# Altium footprint library IC.PcbLib: 386 footprints (part 7 of 30)
Each footprint in its own frame and in the unit in brackets; x right, y up, seen from the top. Pads: shape width x height; smd on the part's side, far side on the other; paste and mask are expansions set on the pad; w line width, h text height; cw(c..) or ccw(c..) is an arc to the next point about the centre after c.
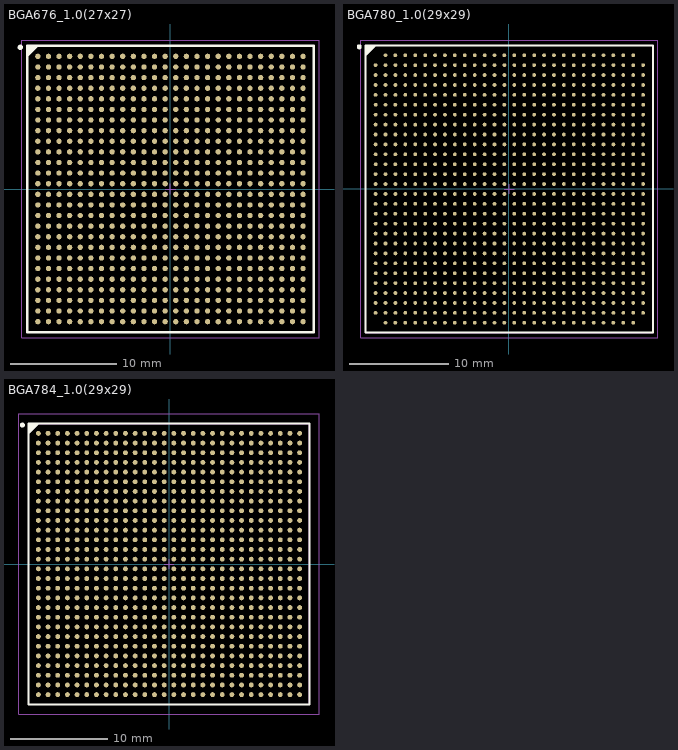
[diagram p6: the footprints below, top view; thin cyan lines are the x and y axes]

## BGA676_1.0(27x27) [mm]
height 0.65
pads (676):
  round 0.5 smd: A1(-12.5,12.525) A2(-11.5,12.525) A3(-10.5,12.525) A4(-9.5,12.525) A5(-8.5,12.525) A6(-7.5,12.525) A7(-6.5,12.525) A8(-5.5,12.525) A9(-4.5,12.525) A10(-3.5,12.525) A11(-2.5,12.525) A12(-1.5,12.525) A13(-0.5,12.525) A14(0.5,12.525) A15(1.5,12.525) A16(2.5,12.525) A17(3.5,12.525) A18(4.5,12.525) A19(5.5,12.525) A20(6.5,12.525) A21(7.5,12.525) A22(8.5,12.525) A23(9.5,12.525) A24(10.5,12.525) A25(11.5,12.525) A26(12.5,12.525) AA1(-12.5,-7.475) AA2(-11.5,-7.475) AA3(-10.5,-7.475) AA4(-9.5,-7.475) AA5(-8.5,-7.475) AA6(-7.5,-7.475) AA7(-6.5,-7.475) AA8(-5.5,-7.475) AA9(-4.5,-7.475) AA10(-3.5,-7.475) AA11(-2.5,-7.475) AA12(-1.5,-7.475) AA13(-0.5,-7.475) AA14(0.5,-7.475) AA15(1.5,-7.475) AA16(2.5,-7.475) AA17(3.5,-7.475) AA18(4.5,-7.475) AA19(5.5,-7.475) AA20(6.5,-7.475) AA21(7.5,-7.475) AA22(8.5,-7.475) AA23(9.5,-7.475) AA24(10.5,-7.475) AA25(11.5,-7.475) AA26(12.5,-7.475) AB1(-12.5,-8.475) AB2(-11.5,-8.475) AB3(-10.5,-8.475) AB4(-9.5,-8.475) AB5(-8.5,-8.475) AB6(-7.5,-8.475) AB7(-6.5,-8.475) AB8(-5.5,-8.475) AB9(-4.5,-8.475) AB10(-3.5,-8.475) AB11(-2.5,-8.475) AB12(-1.5,-8.475) AB13(-0.5,-8.475) AB14(0.5,-8.475) AB15(1.5,-8.475) AB16(2.5,-8.475) AB17(3.5,-8.475) AB18(4.5,-8.475) AB19(5.5,-8.475) AB20(6.5,-8.475) AB21(7.5,-8.475) AB22(8.5,-8.475) AB23(9.5,-8.475) AB24(10.5,-8.475) AB25(11.5,-8.475) AB26(12.5,-8.475) AC1(-12.5,-9.475) AC2(-11.5,-9.475) AC3(-10.5,-9.475) AC4(-9.5,-9.475) AC5(-8.5,-9.475) AC6(-7.5,-9.475) AC7(-6.5,-9.475) AC8(-5.5,-9.475) AC9(-4.5,-9.475) AC10(-3.5,-9.475) AC11(-2.5,-9.475) AC12(-1.5,-9.475) AC13(-0.5,-9.475) AC14(0.5,-9.475) AC15(1.5,-9.475) AC16(2.5,-9.475) AC17(3.5,-9.475) AC18(4.5,-9.475) AC19(5.5,-9.475) AC20(6.5,-9.475) AC21(7.5,-9.475) AC22(8.5,-9.475) AC23(9.5,-9.475) AC24(10.5,-9.475) AC25(11.5,-9.475) AC26(12.5,-9.475) AD1(-12.5,-10.475) AD2(-11.5,-10.475) AD3(-10.5,-10.475) AD4(-9.5,-10.475) AD5(-8.5,-10.475) AD6(-7.5,-10.475) AD7(-6.5,-10.475) AD8(-5.5,-10.475) AD9(-4.5,-10.475) AD10(-3.5,-10.475) AD11(-2.5,-10.475) AD12(-1.5,-10.475) AD13(-0.5,-10.475) AD14(0.5,-10.475) AD15(1.5,-10.475) AD16(2.5,-10.475) AD17(3.5,-10.475) AD18(4.5,-10.475) AD19(5.5,-10.475) AD20(6.5,-10.475) AD21(7.5,-10.475) AD22(8.5,-10.475) AD23(9.5,-10.475) AD24(10.5,-10.475) AD25(11.5,-10.475) AD26(12.5,-10.475) AE1(-12.5,-11.475) AE2(-11.5,-11.475) AE3(-10.5,-11.475) AE4(-9.5,-11.475) AE5(-8.5,-11.475) AE6(-7.5,-11.475) AE7(-6.5,-11.475) AE8(-5.5,-11.475) AE9(-4.5,-11.475) AE10(-3.5,-11.475) AE11(-2.5,-11.475) AE12(-1.5,-11.475) AE13(-0.5,-11.475) AE14(0.5,-11.475) AE15(1.5,-11.475) AE16(2.5,-11.475) AE17(3.5,-11.475) AE18(4.5,-11.475) AE19(5.5,-11.475) AE20(6.5,-11.475) AE21(7.5,-11.475) AE22(8.5,-11.475) AE23(9.5,-11.475) AE24(10.5,-11.475) AE25(11.5,-11.475) AE26(12.5,-11.475) AF1(-12.5,-12.475) AF2(-11.5,-12.475) AF3(-10.5,-12.475) AF4(-9.5,-12.475) AF5(-8.5,-12.475) AF6(-7.5,-12.475) AF7(-6.5,-12.475) AF8(-5.5,-12.475) AF9(-4.5,-12.475) AF10(-3.5,-12.475) AF11(-2.5,-12.475) AF12(-1.5,-12.475) AF13(-0.5,-12.475) AF14(0.5,-12.475) AF15(1.5,-12.475) AF16(2.5,-12.475) AF17(3.5,-12.475) AF18(4.5,-12.475) AF19(5.5,-12.475) AF20(6.5,-12.475) AF21(7.5,-12.475) AF22(8.5,-12.475) AF23(9.5,-12.475) AF24(10.5,-12.475) AF25(11.5,-12.475) AF26(12.5,-12.475) B1(-12.5,11.525) B2(-11.5,11.525) B3(-10.5,11.525) B4(-9.5,11.525) B5(-8.5,11.525) B6(-7.5,11.525) B7(-6.5,11.525) B8(-5.5,11.525) B9(-4.5,11.525) B10(-3.5,11.525) B11(-2.5,11.525) B12(-1.5,11.525) B13(-0.5,11.525) B14(0.5,11.525) B15(1.5,11.525) B16(2.5,11.525) B17(3.5,11.525) B18(4.5,11.525) B19(5.5,11.525) B20(6.5,11.525) B21(7.5,11.525) B22(8.5,11.525) B23(9.5,11.525) B24(10.5,11.525) B25(11.5,11.525) B26(12.5,11.525) C1(-12.5,10.525) C2(-11.5,10.525) C3(-10.5,10.525) C4(-9.5,10.525) C5(-8.5,10.525) C6(-7.5,10.525) C7(-6.5,10.525) C8(-5.5,10.525) C9(-4.5,10.525) C10(-3.5,10.525) C11(-2.5,10.525) C12(-1.5,10.525) C13(-0.5,10.525) C14(0.5,10.525) C15(1.5,10.525) C16(2.5,10.525) C17(3.5,10.525) C18(4.5,10.525) C19(5.5,10.525) C20(6.5,10.525) C21(7.5,10.525) C22(8.5,10.525) C23(9.5,10.525) C24(10.5,10.525) C25(11.5,10.525) C26(12.5,10.525) D1(-12.5,9.525) D2(-11.5,9.525) D3(-10.5,9.525) D4(-9.5,9.525) D5(-8.5,9.525) D6(-7.5,9.525) D7(-6.5,9.525) D8(-5.5,9.525) D9(-4.5,9.525) D10(-3.5,9.525) D11(-2.5,9.525) D12(-1.5,9.525) D13(-0.5,9.525) D14(0.5,9.525) D15(1.5,9.525) D16(2.5,9.525) D17(3.5,9.525) D18(4.5,9.525) D19(5.5,9.525) D20(6.5,9.525) D21(7.5,9.525) D22(8.5,9.525) D23(9.5,9.525) D24(10.5,9.525) D25(11.5,9.525) D26(12.5,9.525) E1(-12.5,8.525) E2(-11.5,8.525) E3(-10.5,8.525) E4(-9.5,8.525) E5(-8.5,8.525) E6(-7.5,8.525) E7(-6.5,8.525) E8(-5.5,8.525) E9(-4.5,8.525) E10(-3.5,8.525) E11(-2.5,8.525) E12(-1.5,8.525) E13(-0.5,8.525) E14(0.5,8.525) E15(1.5,8.525) E16(2.5,8.525) E17(3.5,8.525) E18(4.5,8.525) E19(5.5,8.525) E20(6.5,8.525) E21(7.5,8.525) E22(8.5,8.525) E23(9.5,8.525) E24(10.5,8.525) E25(11.5,8.525) E26(12.5,8.525) F1(-12.5,7.525) F2(-11.5,7.525) F3(-10.5,7.525) F4(-9.5,7.525) F5(-8.5,7.525) F6(-7.5,7.525) F7(-6.5,7.525) F8(-5.5,7.525) F9(-4.5,7.525) F10(-3.5,7.525) F11(-2.5,7.525) F12(-1.5,7.525) F13(-0.5,7.525) F14(0.5,7.525) F15(1.5,7.525) F16(2.5,7.525) F17(3.5,7.525) F18(4.5,7.525) F19(5.5,7.525) F20(6.5,7.525) F21(7.5,7.525) F22(8.5,7.525) F23(9.5,7.525) F24(10.5,7.525) F25(11.5,7.525) F26(12.5,7.525) G1(-12.5,6.525) G2(-11.5,6.525) G3(-10.5,6.525) G4(-9.5,6.525) G5(-8.5,6.525) G6(-7.5,6.525) G7(-6.5,6.525) G8(-5.5,6.525) G9(-4.5,6.525) G10(-3.5,6.525) G11(-2.5,6.525) G12(-1.5,6.525) G13(-0.5,6.525) G14(0.5,6.525) G15(1.5,6.525) G16(2.5,6.525) G17(3.5,6.525) G18(4.5,6.525) G19(5.5,6.525) G20(6.5,6.525) G21(7.5,6.525) G22(8.5,6.525) G23(9.5,6.525) G24(10.5,6.525) G25(11.5,6.525) G26(12.5,6.525) H1(-12.5,5.525) H2(-11.5,5.525) H3(-10.5,5.525) H4(-9.5,5.525) H5(-8.5,5.525) H6(-7.5,5.525) H7(-6.5,5.525) H8(-5.5,5.525) H9(-4.5,5.525) H10(-3.5,5.525) H11(-2.5,5.525) H12(-1.5,5.525) H13(-0.5,5.525) H14(0.5,5.525) H15(1.5,5.525) H16(2.5,5.525) H17(3.5,5.525) H18(4.5,5.525) H19(5.5,5.525) H20(6.5,5.525) H21(7.5,5.525) H22(8.5,5.525) H23(9.5,5.525) H24(10.5,5.525) H25(11.5,5.525) H26(12.5,5.525) J1(-12.5,4.525) J2(-11.5,4.525) J3(-10.5,4.525) J4(-9.5,4.525) J5(-8.5,4.525) J6(-7.5,4.525) J7(-6.5,4.525) J8(-5.5,4.525) J9(-4.5,4.525) J10(-3.5,4.525) J11(-2.5,4.525) J12(-1.5,4.525) J13(-0.5,4.525) J14(0.5,4.525) J15(1.5,4.525) J16(2.5,4.525) J17(3.5,4.525) J18(4.5,4.525) J19(5.5,4.525) J20(6.5,4.525) J21(7.5,4.525) J22(8.5,4.525) J23(9.5,4.525) J24(10.5,4.525) J25(11.5,4.525) J26(12.5,4.525) K1(-12.5,3.525) K2(-11.5,3.525) K3(-10.5,3.525) K4(-9.5,3.525) K5(-8.5,3.525) K6(-7.5,3.525) K7(-6.5,3.525) K8(-5.5,3.525) K9(-4.5,3.525) K10(-3.5,3.525) K11(-2.5,3.525) K12(-1.5,3.525) K13(-0.5,3.525) K14(0.5,3.525) K15(1.5,3.525) K16(2.5,3.525) K17(3.5,3.525) K18(4.5,3.525) K19(5.5,3.525) K20(6.5,3.525) K21(7.5,3.525) K22(8.5,3.525) K23(9.5,3.525) K24(10.5,3.525) K25(11.5,3.525) K26(12.5,3.525) L1(-12.5,2.525) L2(-11.5,2.525) L3(-10.5,2.525) L4(-9.5,2.525) L5(-8.5,2.525) L6(-7.5,2.525) L7(-6.5,2.525) L8(-5.5,2.525) L9(-4.5,2.525) L10(-3.5,2.525) L11(-2.5,2.525) L12(-1.5,2.525) L13(-0.5,2.525) L14(0.5,2.525) L15(1.5,2.525) L16(2.5,2.525) L17(3.5,2.525) L18(4.5,2.525) L19(5.5,2.525) L20(6.5,2.525) L21(7.5,2.525) L22(8.5,2.525) L23(9.5,2.525) L24(10.5,2.525) L25(11.5,2.525) L26(12.5,2.525) M1(-12.5,1.525) M2(-11.5,1.525) M3(-10.5,1.525) M4(-9.5,1.525) M5(-8.5,1.525) M6(-7.5,1.525) M7(-6.5,1.525) M8(-5.5,1.525) M9(-4.5,1.525) M10(-3.5,1.525) M11(-2.5,1.525) M12(-1.5,1.525) M13(-0.5,1.525) M14(0.5,1.525) M15(1.5,1.525) M16(2.5,1.525) M17(3.5,1.525) M18(4.5,1.525) M19(5.5,1.525) M20(6.5,1.525) M21(7.5,1.525) M22(8.5,1.525) M23(9.5,1.525) M24(10.5,1.525) M25(11.5,1.525) M26(12.5,1.525) N1(-12.5,0.525) N2(-11.5,0.525) N3(-10.5,0.525) N4(-9.5,0.525) N5(-8.5,0.525) N6(-7.5,0.525) N7(-6.5,0.525) N8(-5.5,0.525) N9(-4.5,0.525) N10(-3.5,0.525) N11(-2.5,0.525) N12(-1.5,0.525) N13(-0.5,0.525) N14(0.5,0.525) N15(1.5,0.525) N16(2.5,0.525) N17(3.5,0.525) N18(4.5,0.525) N19(5.5,0.525) N20(6.5,0.525) N21(7.5,0.525) N22(8.5,0.525) N23(9.5,0.525) N24(10.5,0.525) N25(11.5,0.525) N26(12.5,0.525) P1(-12.5,-0.475) P2(-11.5,-0.475) P3(-10.5,-0.475) P4(-9.5,-0.475) P5(-8.5,-0.475) P6(-7.5,-0.475) P7(-6.5,-0.475) P8(-5.5,-0.475) P9(-4.5,-0.475) P10(-3.5,-0.475) P11(-2.5,-0.475) P12(-1.5,-0.475) P13(-0.5,-0.475) P14(0.5,-0.475) P15(1.5,-0.475) P16(2.5,-0.475) P17(3.5,-0.475) P18(4.5,-0.475) P19(5.5,-0.475) P20(6.5,-0.475) P21(7.5,-0.475) P22(8.5,-0.475) P23(9.5,-0.475) P24(10.5,-0.475) P25(11.5,-0.475) P26(12.5,-0.475) R1(-12.5,-1.475) R2(-11.5,-1.475) R3(-10.5,-1.475) R4(-9.5,-1.475) R5(-8.5,-1.475) R6(-7.5,-1.475) R7(-6.5,-1.475) R8(-5.5,-1.475) R9(-4.5,-1.475) R10(-3.5,-1.475) R11(-2.5,-1.475) R12(-1.5,-1.475) R13(-0.5,-1.475) R14(0.5,-1.475) R15(1.5,-1.475) R16(2.5,-1.475) R17(3.5,-1.475) R18(4.5,-1.475) R19(5.5,-1.475) R20(6.5,-1.475) R21(7.5,-1.475) R22(8.5,-1.475) R23(9.5,-1.475) R24(10.5,-1.475) R25(11.5,-1.475) R26(12.5,-1.475) T1(-12.5,-2.475) T2(-11.5,-2.475) T3(-10.5,-2.475) T4(-9.5,-2.475) T5(-8.5,-2.475) T6(-7.5,-2.475) T7(-6.5,-2.475) T8(-5.5,-2.475) T9(-4.5,-2.475) T10(-3.5,-2.475) T11(-2.5,-2.475) T12(-1.5,-2.475) T13(-0.5,-2.475) T14(0.5,-2.475) T15(1.5,-2.475) T16(2.5,-2.475) T17(3.5,-2.475) T18(4.5,-2.475) T19(5.5,-2.475) T20(6.5,-2.475) T21(7.5,-2.475) T22(8.5,-2.475) T23(9.5,-2.475) T24(10.5,-2.475) T25(11.5,-2.475) T26(12.5,-2.475) U1(-12.5,-3.475) U2(-11.5,-3.475) U3(-10.5,-3.475) U4(-9.5,-3.475) U5(-8.5,-3.475) U6(-7.5,-3.475) U7(-6.5,-3.475) U8(-5.5,-3.475) U9(-4.5,-3.475) U10(-3.5,-3.475) U11(-2.5,-3.475) U12(-1.5,-3.475) U13(-0.5,-3.475) U14(0.5,-3.475) U15(1.5,-3.475) U16(2.5,-3.475) U17(3.5,-3.475) U18(4.5,-3.475) U19(5.5,-3.475) U20(6.5,-3.475) U21(7.5,-3.475) U22(8.5,-3.475) U23(9.5,-3.475) U24(10.5,-3.475) U25(11.5,-3.475) U26(12.5,-3.475) V1(-12.5,-4.475) V2(-11.5,-4.475) V3(-10.5,-4.475) V4(-9.5,-4.475) V5(-8.5,-4.475) V6(-7.5,-4.475) V7(-6.5,-4.475) V8(-5.5,-4.475) V9(-4.5,-4.475) V10(-3.5,-4.475) V11(-2.5,-4.475) V12(-1.5,-4.475) V13(-0.5,-4.475) V14(0.5,-4.475) V15(1.5,-4.475) V16(2.5,-4.475) V17(3.5,-4.475) V18(4.5,-4.475) V19(5.5,-4.475) V20(6.5,-4.475) V21(7.5,-4.475) V22(8.5,-4.475) V23(9.5,-4.475) V24(10.5,-4.475) V25(11.5,-4.475) V26(12.5,-4.475) W1(-12.5,-5.475) W2(-11.5,-5.475) W3(-10.5,-5.475) W4(-9.5,-5.475) W5(-8.5,-5.475) W6(-7.5,-5.475) W7(-6.5,-5.475) W8(-5.5,-5.475) W9(-4.5,-5.475) W10(-3.5,-5.475) W11(-2.5,-5.475) W12(-1.5,-5.475) W13(-0.5,-5.475) W14(0.5,-5.475) W15(1.5,-5.475) W16(2.5,-5.475) W17(3.5,-5.475) W18(4.5,-5.475) W19(5.5,-5.475) W20(6.5,-5.475) W21(7.5,-5.475) W22(8.5,-5.475) W23(9.5,-5.475) W24(10.5,-5.475) W25(11.5,-5.475) W26(12.5,-5.475) Y1(-12.5,-6.475) Y2(-11.5,-6.475) Y3(-10.5,-6.475) Y4(-9.5,-6.475) Y5(-8.5,-6.475) Y6(-7.5,-6.475) Y7(-6.5,-6.475) Y8(-5.5,-6.475) Y9(-4.5,-6.475) Y10(-3.5,-6.475) Y11(-2.5,-6.475) Y12(-1.5,-6.475) Y13(-0.5,-6.475) Y14(0.5,-6.475) Y15(1.5,-6.475) Y16(2.5,-6.475) Y17(3.5,-6.475) Y18(4.5,-6.475) Y19(5.5,-6.475) Y20(6.5,-6.475) Y21(7.5,-6.475) Y22(8.5,-6.475) Y23(9.5,-6.475) Y24(10.5,-6.475) Y25(11.5,-6.475) Y26(12.5,-6.475)
Top Overlay:
  circle w0.25: c-14.15,13.375 r0.125
  region: -12.5,13.525 -13.5,12.525 -13.5,13.525
  lines w0.2: -13.5,12.525 -12.5,13.525 ; -13.5,-13.475 13.5,-13.475 13.5,13.525 -13.5,13.525 -13.5,-13.475
Mechanical 13:
  lines w0.1: -13.5,-13.475 13.5,-13.475 13.5,13.525 -13.5,13.525 -13.5,-13.475
Mechanical 15:
  lines w0.05: -14,-13.975 14,-13.975 14,14.025 -14,14.025 -14,-13.975
  lines w0.1: -0.5,0.025 0.5,0.025 ; 0,-0.475 0,0.525
3D body "User Library-BGA_676_27x27_P1_00_PLS.step": height 2.95, standoff 0.05, extent -13.825,-13.774 13.775,13.826

## BGA780_1.0(29x29) [mm]
pads (780):
  round 0.38 smd: A2(-12.449,13.475) A3(-11.449,13.475) A4(-10.449,13.475) A5(-9.449,13.475) A6(-8.449,13.475) A7(-7.449,13.475) A8(-6.449,13.475) A9(-5.449,13.475) A10(-4.449,13.475) A11(-3.449,13.475) A12(-2.449,13.475) A13(-1.449,13.475) A14(-0.449,13.475) A15(0.551,13.475) A16(1.551,13.475) A17(2.551,13.475) A18(3.551,13.475) A19(4.551,13.475) A20(5.551,13.475) A21(6.551,13.475) A22(7.551,13.475) A23(8.551,13.475) A24(9.551,13.475) A25(10.551,13.475) A26(11.551,13.475) A27(12.551,13.475) AA1(-13.449,-6.525) AA2(-12.449,-6.525) AA3(-11.449,-6.525) AA4(-10.449,-6.525) AA5(-9.449,-6.525) AA6(-8.449,-6.525) AA7(-7.449,-6.525) AA8(-6.449,-6.525) AA9(-5.449,-6.525) AA10(-4.449,-6.525) AA11(-3.449,-6.525) AA12(-2.449,-6.525) AA13(-1.449,-6.525) AA14(-0.449,-6.525) AA15(0.551,-6.525) AA16(1.551,-6.525) AA17(2.551,-6.525) AA18(3.551,-6.525) AA19(4.551,-6.525) AA20(5.551,-6.525) AA21(6.551,-6.525) AA22(7.551,-6.525) AA23(8.551,-6.525) AA24(9.551,-6.525) AA25(10.551,-6.525) AA26(11.551,-6.525) AA27(12.551,-6.525) AA28(13.551,-6.525) AB1(-13.449,-7.525) AB2(-12.449,-7.525) AB3(-11.449,-7.525) AB4(-10.449,-7.525) AB5(-9.449,-7.525) AB6(-8.449,-7.525) AB7(-7.449,-7.525) AB8(-6.449,-7.525) AB9(-5.449,-7.525) AB10(-4.449,-7.525) AB11(-3.449,-7.525) AB12(-2.449,-7.525) AB13(-1.449,-7.525) AB14(-0.449,-7.525) AB15(0.551,-7.525) AB16(1.551,-7.525) AB17(2.551,-7.525) AB18(3.551,-7.525) AB19(4.551,-7.525) AB20(5.551,-7.525) AB21(6.551,-7.525) AB22(7.551,-7.525) AB23(8.551,-7.525) AB24(9.551,-7.525) AB25(10.551,-7.525) AB26(11.551,-7.525) AB27(12.551,-7.525) AB28(13.551,-7.525) AC1(-13.449,-8.525) AC2(-12.449,-8.525) AC3(-11.449,-8.525) AC4(-10.449,-8.525) AC5(-9.449,-8.525) AC6(-8.449,-8.525) AC7(-7.449,-8.525) AC8(-6.449,-8.525) AC9(-5.449,-8.525) AC10(-4.449,-8.525) AC11(-3.449,-8.525) AC12(-2.449,-8.525) AC13(-1.449,-8.525) AC14(-0.449,-8.525) AC15(0.551,-8.525) AC16(1.551,-8.525) AC17(2.551,-8.525) AC18(3.551,-8.525) AC19(4.551,-8.525) AC20(5.551,-8.525) AC21(6.551,-8.525) AC22(7.551,-8.525) AC23(8.551,-8.525) AC24(9.551,-8.525) AC25(10.551,-8.525) AC26(11.551,-8.525) AC27(12.551,-8.525) AC28(13.551,-8.525) AD1(-13.449,-9.525) AD2(-12.449,-9.525) AD3(-11.449,-9.525) AD4(-10.449,-9.525) AD5(-9.449,-9.525) AD6(-8.449,-9.525) AD7(-7.449,-9.525) AD8(-6.449,-9.525) AD9(-5.449,-9.525) AD10(-4.449,-9.525) AD11(-3.449,-9.525) AD12(-2.449,-9.525) AD13(-1.449,-9.525) AD14(-0.449,-9.525) AD15(0.551,-9.525) AD16(1.551,-9.525) AD17(2.551,-9.525) AD18(3.551,-9.525) AD19(4.551,-9.525) AD20(5.551,-9.525) AD21(6.551,-9.525) AD22(7.551,-9.525) AD23(8.551,-9.525) AD24(9.551,-9.525) AD25(10.551,-9.525) AD26(11.551,-9.525) AD27(12.551,-9.525) AD28(13.551,-9.525) AE1(-13.449,-10.525) AE2(-12.449,-10.525) AE3(-11.449,-10.525) AE4(-10.449,-10.525) AE5(-9.449,-10.525) AE6(-8.449,-10.525) AE7(-7.449,-10.525) AE8(-6.449,-10.525) AE9(-5.449,-10.525) AE10(-4.449,-10.525) AE11(-3.449,-10.525) AE12(-2.449,-10.525) AE13(-1.449,-10.525) AE14(-0.449,-10.525) AE15(0.551,-10.525) AE16(1.551,-10.525) AE17(2.551,-10.525) AE18(3.551,-10.525) AE19(4.551,-10.525) AE20(5.551,-10.525) AE21(6.551,-10.525) AE22(7.551,-10.525) AE23(8.551,-10.525) AE24(9.551,-10.525) AE25(10.551,-10.525) AE26(11.551,-10.525) AE27(12.551,-10.525) AE28(13.551,-10.525) AF1(-13.449,-11.525) AF2(-12.449,-11.525) AF3(-11.449,-11.525) AF4(-10.449,-11.525) AF5(-9.449,-11.525) AF6(-8.449,-11.525) AF7(-7.449,-11.525) AF8(-6.449,-11.525) AF9(-5.449,-11.525) AF10(-4.449,-11.525) AF11(-3.449,-11.525) AF12(-2.449,-11.525) AF13(-1.449,-11.525) AF14(-0.449,-11.525) AF15(0.551,-11.525) AF16(1.551,-11.525) AF17(2.551,-11.525) AF18(3.551,-11.525) AF19(4.551,-11.525) AF20(5.551,-11.525) AF21(6.551,-11.525) AF22(7.551,-11.525) AF23(8.551,-11.525) AF24(9.551,-11.525) AF25(10.551,-11.525) AF26(11.551,-11.525) AF27(12.551,-11.525) AF28(13.551,-11.525) AG1(-13.449,-12.525) AG2(-12.449,-12.525) AG3(-11.449,-12.525) AG4(-10.449,-12.525) AG5(-9.449,-12.525) AG6(-8.449,-12.525) AG7(-7.449,-12.525) AG8(-6.449,-12.525) AG9(-5.449,-12.525) AG10(-4.449,-12.525) AG11(-3.449,-12.525) AG12(-2.449,-12.525) AG13(-1.449,-12.525) AG14(-0.449,-12.525) AG15(0.551,-12.525) AG16(1.551,-12.525) AG17(2.551,-12.525) AG18(3.551,-12.525) AG19(4.551,-12.525) AG20(5.551,-12.525) AG21(6.551,-12.525) AG22(7.551,-12.525) AG23(8.551,-12.525) AG24(9.551,-12.525) AG25(10.551,-12.525) AG26(11.551,-12.525) AG27(12.551,-12.525) AG28(13.551,-12.525) AH2(-12.449,-13.525) AH3(-11.449,-13.525) AH4(-10.449,-13.525) AH5(-9.449,-13.525) AH6(-8.449,-13.525) AH7(-7.449,-13.525) AH8(-6.449,-13.525) AH9(-5.449,-13.525) AH10(-4.449,-13.525) AH11(-3.449,-13.525) AH12(-2.449,-13.525) AH13(-1.449,-13.525) AH14(-0.449,-13.525) AH15(0.551,-13.525) AH16(1.551,-13.525) AH17(2.551,-13.525) AH18(3.551,-13.525) AH19(4.551,-13.525) AH20(5.551,-13.525) AH21(6.551,-13.525) AH22(7.551,-13.525) AH23(8.551,-13.525) AH24(9.551,-13.525) AH25(10.551,-13.525) AH26(11.551,-13.525) AH27(12.551,-13.525) B1(-13.449,12.475) B2(-12.449,12.475) B3(-11.449,12.475) B4(-10.449,12.475) B5(-9.449,12.475) B6(-8.449,12.475) B7(-7.449,12.475) B8(-6.449,12.475) B9(-5.449,12.475) B10(-4.449,12.475) B11(-3.449,12.475) B12(-2.449,12.475) B13(-1.449,12.475) B14(-0.449,12.475) B15(0.551,12.475) B16(1.551,12.475) B17(2.551,12.475) B18(3.551,12.475) B19(4.551,12.475) B20(5.551,12.475) B21(6.551,12.475) B22(7.551,12.475) B23(8.551,12.475) B24(9.551,12.475) B25(10.551,12.475) B26(11.551,12.475) B27(12.551,12.475) B28(13.551,12.475) C1(-13.449,11.475) C2(-12.449,11.475) C3(-11.449,11.475) C4(-10.449,11.475) C5(-9.449,11.475) C6(-8.449,11.475) C7(-7.449,11.475) C8(-6.449,11.475) C9(-5.449,11.475) C10(-4.449,11.475) C11(-3.449,11.475) C12(-2.449,11.475) C13(-1.449,11.475) C14(-0.449,11.475) C15(0.551,11.475) C16(1.551,11.475) C17(2.551,11.475) C18(3.551,11.475) C19(4.551,11.475) C20(5.551,11.475) C21(6.551,11.475) C22(7.551,11.475) C23(8.551,11.475) C24(9.551,11.475) C25(10.551,11.475) C26(11.551,11.475) C27(12.551,11.475) C28(13.551,11.475) D1(-13.449,10.475) D2(-12.449,10.475) D3(-11.449,10.475) D4(-10.449,10.475) D5(-9.449,10.475) D6(-8.449,10.475) D7(-7.449,10.475) D8(-6.449,10.475) D9(-5.449,10.475) D10(-4.449,10.475) D11(-3.449,10.475) D12(-2.449,10.475) D13(-1.449,10.475) D14(-0.449,10.475) D15(0.551,10.475) D16(1.551,10.475) D17(2.551,10.475) D18(3.551,10.475) D19(4.551,10.475) D20(5.551,10.475) D21(6.551,10.475) D22(7.551,10.475) D23(8.551,10.475) D24(9.551,10.475) D25(10.551,10.475) D26(11.551,10.475) D27(12.551,10.475) D28(13.551,10.475) E1(-13.449,9.475) E2(-12.449,9.475) E3(-11.449,9.475) E4(-10.449,9.475) E5(-9.449,9.475) E6(-8.449,9.475) E7(-7.449,9.475) E8(-6.449,9.475) E9(-5.449,9.475) E10(-4.449,9.475) E11(-3.449,9.475) E12(-2.449,9.475) E13(-1.449,9.475) E14(-0.449,9.475) E15(0.551,9.475) E16(1.551,9.475) E17(2.551,9.475) E18(3.551,9.475) E19(4.551,9.475) E20(5.551,9.475) E21(6.551,9.475) E22(7.551,9.475) E23(8.551,9.475) E24(9.551,9.475) E25(10.551,9.475) E26(11.551,9.475) E27(12.551,9.475) E28(13.551,9.475) F1(-13.449,8.475) F2(-12.449,8.475) F3(-11.449,8.475) F4(-10.449,8.475) F5(-9.449,8.475) F6(-8.449,8.475) F7(-7.449,8.475) F8(-6.449,8.475) F9(-5.449,8.475) F10(-4.449,8.475) F11(-3.449,8.475) F12(-2.449,8.475) F13(-1.449,8.475) F14(-0.449,8.475) F15(0.551,8.475) F16(1.551,8.475) F17(2.551,8.475) F18(3.551,8.475) F19(4.551,8.475) F20(5.551,8.475) F21(6.551,8.475) F22(7.551,8.475) F23(8.551,8.475) F24(9.551,8.475) F25(10.551,8.475) F26(11.551,8.475) F27(12.551,8.475) F28(13.551,8.475) G1(-13.449,7.475) G2(-12.449,7.475) G3(-11.449,7.475) G4(-10.449,7.475) G5(-9.449,7.475) G6(-8.449,7.475) G7(-7.449,7.475) G8(-6.449,7.475) G9(-5.449,7.475) G10(-4.449,7.475) G11(-3.449,7.475) G12(-2.449,7.475) G13(-1.449,7.475) G14(-0.449,7.475) G15(0.551,7.475) G16(1.551,7.475) G17(2.551,7.475) G18(3.551,7.475) G19(4.551,7.475) G20(5.551,7.475) G21(6.551,7.475) G22(7.551,7.475) G23(8.551,7.475) G24(9.551,7.475) G25(10.551,7.475) G26(11.551,7.475) G27(12.551,7.475) G28(13.551,7.475) H1(-13.449,6.475) H2(-12.449,6.475) H3(-11.449,6.475) H4(-10.449,6.475) H5(-9.449,6.475) H6(-8.449,6.475) H7(-7.449,6.475) H8(-6.449,6.475) H9(-5.449,6.475) H10(-4.449,6.475) H11(-3.449,6.475) H12(-2.449,6.475) H13(-1.449,6.475) H14(-0.449,6.475) H15(0.551,6.475) H16(1.551,6.475) H17(2.551,6.475) H18(3.551,6.475) H19(4.551,6.475) H20(5.551,6.475) H21(6.551,6.475) H22(7.551,6.475) H23(8.551,6.475) H24(9.551,6.475) H25(10.551,6.475) H26(11.551,6.475) H27(12.551,6.475) H28(13.551,6.475) J1(-13.449,5.475) J2(-12.449,5.475) J3(-11.449,5.475) J4(-10.449,5.475) J5(-9.449,5.475) J6(-8.449,5.475) J7(-7.449,5.475) J8(-6.449,5.475) J9(-5.449,5.475) J10(-4.449,5.475) J11(-3.449,5.475) J12(-2.449,5.475) J13(-1.449,5.475) J14(-0.449,5.475) J15(0.551,5.475) J16(1.551,5.475) J17(2.551,5.475) J18(3.551,5.475) J19(4.551,5.475) J20(5.551,5.475) J21(6.551,5.475) J22(7.551,5.475) J23(8.551,5.475) J24(9.551,5.475) J25(10.551,5.475) J26(11.551,5.475) J27(12.551,5.475) J28(13.551,5.475) K1(-13.449,4.475) K2(-12.449,4.475) K3(-11.449,4.475) K4(-10.449,4.475) K5(-9.449,4.475) K6(-8.449,4.475) K7(-7.449,4.475) K8(-6.449,4.475) K9(-5.449,4.475) K10(-4.449,4.475) K11(-3.449,4.475) K12(-2.449,4.475) K13(-1.449,4.475) K14(-0.449,4.475) K15(0.551,4.475) K16(1.551,4.475) K17(2.551,4.475) K18(3.551,4.475) K19(4.551,4.475) K20(5.551,4.475) K21(6.551,4.475) K22(7.551,4.475) K23(8.551,4.475) K24(9.551,4.475) K25(10.551,4.475) K26(11.551,4.475) K27(12.551,4.475) K28(13.551,4.475) L1(-13.449,3.475) L2(-12.449,3.475) L3(-11.449,3.475) L4(-10.449,3.475) L5(-9.449,3.475) L6(-8.449,3.475) L7(-7.449,3.475) L8(-6.449,3.475) L9(-5.449,3.475) L10(-4.449,3.475) L11(-3.449,3.475) L12(-2.449,3.475) L13(-1.449,3.475) L14(-0.449,3.475) L15(0.551,3.475) L16(1.551,3.475) L17(2.551,3.475) L18(3.551,3.475) L19(4.551,3.475) L20(5.551,3.475) L21(6.551,3.475) L22(7.551,3.475) L23(8.551,3.475) L24(9.551,3.475) L25(10.551,3.475) L26(11.551,3.475) L27(12.551,3.475) L28(13.551,3.475) M1(-13.449,2.475) M2(-12.449,2.475) M3(-11.449,2.475) M4(-10.449,2.475) M5(-9.449,2.475) M6(-8.449,2.475) M7(-7.449,2.475) M8(-6.449,2.475) M9(-5.449,2.475) M10(-4.449,2.475) M11(-3.449,2.475) M12(-2.449,2.475) M13(-1.449,2.475) M14(-0.449,2.475) M15(0.551,2.475) M16(1.551,2.475) M17(2.551,2.475) M18(3.551,2.475) M19(4.551,2.475) M20(5.551,2.475) M21(6.551,2.475) M22(7.551,2.475) M23(8.551,2.475) M24(9.551,2.475) M25(10.551,2.475) M26(11.551,2.475) M27(12.551,2.475) M28(13.551,2.475) N1(-13.449,1.475) N2(-12.449,1.475) N3(-11.449,1.475) N4(-10.449,1.475) N5(-9.449,1.475) N6(-8.449,1.475) N7(-7.449,1.475) N8(-6.449,1.475) N9(-5.449,1.475) N10(-4.449,1.475) N11(-3.449,1.475) N12(-2.449,1.475) N13(-1.449,1.475) N14(-0.449,1.475) N15(0.551,1.475) N16(1.551,1.475) N17(2.551,1.475) N18(3.551,1.475) N19(4.551,1.475) N20(5.551,1.475) N21(6.551,1.475) N22(7.551,1.475) N23(8.551,1.475) N24(9.551,1.475) N25(10.551,1.475) N26(11.551,1.475) N27(12.551,1.475) N28(13.551,1.475) P1(-13.449,0.475) P2(-12.449,0.475) P3(-11.449,0.475) P4(-10.449,0.475) P5(-9.449,0.475) P6(-8.449,0.475) P7(-7.449,0.475) P8(-6.449,0.475) P9(-5.449,0.475) P10(-4.449,0.475) P11(-3.449,0.475) P12(-2.449,0.475) P13(-1.449,0.475) P14(-0.449,0.475) P15(0.551,0.475) P16(1.551,0.475) P17(2.551,0.475) P18(3.551,0.475) P19(4.551,0.475) P20(5.551,0.475) P21(6.551,0.475) P22(7.551,0.475) P23(8.551,0.475) P24(9.551,0.475) P25(10.551,0.475) P26(11.551,0.475) P27(12.551,0.475) P28(13.551,0.475) R1(-13.449,-0.525) R2(-12.449,-0.525) R3(-11.449,-0.525) R4(-10.449,-0.525) R5(-9.449,-0.525) R6(-8.449,-0.525) R7(-7.449,-0.525) R8(-6.449,-0.525) R9(-5.449,-0.525) R10(-4.449,-0.525) R11(-3.449,-0.525) R12(-2.449,-0.525) R13(-1.449,-0.525) R14(-0.449,-0.525) R15(0.551,-0.525) R16(1.551,-0.525) R17(2.551,-0.525) R18(3.551,-0.525) R19(4.551,-0.525) R20(5.551,-0.525) R21(6.551,-0.525) R22(7.551,-0.525) R23(8.551,-0.525) R24(9.551,-0.525) R25(10.551,-0.525) R26(11.551,-0.525) R27(12.551,-0.525) R28(13.551,-0.525) T1(-13.449,-1.525) T2(-12.449,-1.525) T3(-11.449,-1.525) T4(-10.449,-1.525) T5(-9.449,-1.525) T6(-8.449,-1.525) T7(-7.449,-1.525) T8(-6.449,-1.525) T9(-5.449,-1.525) T10(-4.449,-1.525) T11(-3.449,-1.525) T12(-2.449,-1.525) T13(-1.449,-1.525) T14(-0.449,-1.525) T15(0.551,-1.525) T16(1.551,-1.525) T17(2.551,-1.525) T18(3.551,-1.525) T19(4.551,-1.525) T20(5.551,-1.525) T21(6.551,-1.525) T22(7.551,-1.525) T23(8.551,-1.525) T24(9.551,-1.525) T25(10.551,-1.525) T26(11.551,-1.525) T27(12.551,-1.525) T28(13.551,-1.525) U1(-13.449,-2.525) U2(-12.449,-2.525) U3(-11.449,-2.525) U4(-10.449,-2.525) U5(-9.449,-2.525) U6(-8.449,-2.525) U7(-7.449,-2.525) U8(-6.449,-2.525) U9(-5.449,-2.525) U10(-4.449,-2.525) U11(-3.449,-2.525) U12(-2.449,-2.525) U13(-1.449,-2.525) U14(-0.449,-2.525) U15(0.551,-2.525) U16(1.551,-2.525) U17(2.551,-2.525) U18(3.551,-2.525) U19(4.551,-2.525) U20(5.551,-2.525) U21(6.551,-2.525) U22(7.551,-2.525) U23(8.551,-2.525) U24(9.551,-2.525) U25(10.551,-2.525) U26(11.551,-2.525) U27(12.551,-2.525) U28(13.551,-2.525) V1(-13.449,-3.525) V2(-12.449,-3.525) V3(-11.449,-3.525) V4(-10.449,-3.525) V5(-9.449,-3.525) V6(-8.449,-3.525) V7(-7.449,-3.525) V8(-6.449,-3.525) V9(-5.449,-3.525) V10(-4.449,-3.525) V11(-3.449,-3.525) V12(-2.449,-3.525) V13(-1.449,-3.525) V14(-0.449,-3.525) V15(0.551,-3.525) V16(1.551,-3.525) V17(2.551,-3.525) V18(3.551,-3.525) V19(4.551,-3.525) V20(5.551,-3.525) V21(6.551,-3.525) V22(7.551,-3.525) V23(8.551,-3.525) V24(9.551,-3.525) V25(10.551,-3.525) V26(11.551,-3.525) V27(12.551,-3.525) V28(13.551,-3.525) W1(-13.449,-4.525) W2(-12.449,-4.525) W3(-11.449,-4.525) W4(-10.449,-4.525) W5(-9.449,-4.525) W6(-8.449,-4.525) W7(-7.449,-4.525) W8(-6.449,-4.525) W9(-5.449,-4.525) W10(-4.449,-4.525) W11(-3.449,-4.525) W12(-2.449,-4.525) W13(-1.449,-4.525) W14(-0.449,-4.525) W15(0.551,-4.525) W16(1.551,-4.525) W17(2.551,-4.525) W18(3.551,-4.525) W19(4.551,-4.525) W20(5.551,-4.525) W21(6.551,-4.525) W22(7.551,-4.525) W23(8.551,-4.525) W24(9.551,-4.525) W25(10.551,-4.525) W26(11.551,-4.525) W27(12.551,-4.525) W28(13.551,-4.525) Y1(-13.449,-5.525) Y2(-12.449,-5.525) Y3(-11.449,-5.525) Y4(-10.449,-5.525) Y5(-9.449,-5.525) Y6(-8.449,-5.525) Y7(-7.449,-5.525) Y8(-6.449,-5.525) Y9(-5.449,-5.525) Y10(-4.449,-5.525) Y11(-3.449,-5.525) Y12(-2.449,-5.525) Y13(-1.449,-5.525) Y14(-0.449,-5.525) Y15(0.551,-5.525) Y16(1.551,-5.525) Y17(2.551,-5.525) Y18(3.551,-5.525) Y19(4.551,-5.525) Y20(5.551,-5.525) Y21(6.551,-5.525) Y22(7.551,-5.525) Y23(8.551,-5.525) Y24(9.551,-5.525) Y25(10.551,-5.525) Y26(11.551,-5.525) Y27(12.551,-5.525) Y28(13.551,-5.525)
Top Overlay:
  circle w0.25: c-15.099,14.325 r0.125
  region: -13.449,14.475 -14.449,13.475 -14.449,14.475
  lines w0.2: -14.449,13.475 -13.449,14.475 ; -14.449,-14.525 -14.449,14.475 14.551,14.475 14.551,-14.525 -14.449,-14.525
Mechanical 13:
  lines w0.1: -14.449,-14.525 -14.449,14.475 14.551,14.475 14.551,-14.525 -14.449,-14.525
Mechanical 15:
  lines w0.05: -14.949,-15.025 -14.949,14.975 15.051,14.975 15.051,-15.025 -14.949,-15.025
  lines w0.1: -0.449,-0.025 0.551,-0.025 ; 0.051,-0.525 0.051,0.475
3D body "BGA784C100P28X28_2900X2900X240.step": height 2.4, standoff 0, extent -14.449,-14.475 14.551,14.525

## BGA784_1.0(29x29) [mm]
pads (784):
  round 0.5 smd: A1(-13.515,13.508) A2(-12.515,13.508) A3(-11.515,13.508) A4(-10.515,13.508) A5(-9.515,13.508) A6(-8.515,13.508) A7(-7.515,13.508) A8(-6.515,13.508) A9(-5.515,13.508) A10(-4.515,13.508) A11(-3.515,13.508) A12(-2.515,13.508) A13(-1.515,13.508) A14(-0.515,13.508) A15(0.485,13.508) A16(1.485,13.508) A17(2.485,13.508) A18(3.485,13.508) A19(4.485,13.508) A20(5.485,13.508) A21(6.485,13.508) A22(7.485,13.508) A23(8.485,13.508) A24(9.485,13.508) A25(10.485,13.508) A26(11.485,13.508) A27(12.485,13.508) A28(13.485,13.508) AA1(-13.515,-6.492) AA2(-12.515,-6.492) AA3(-11.515,-6.492) AA4(-10.515,-6.492) AA5(-9.515,-6.492) AA6(-8.515,-6.492) AA7(-7.515,-6.492) AA8(-6.515,-6.492) AA9(-5.515,-6.492) AA10(-4.515,-6.492) AA11(-3.515,-6.492) AA12(-2.515,-6.492) AA13(-1.515,-6.492) AA14(-0.515,-6.492) AA15(0.485,-6.492) AA16(1.485,-6.492) AA17(2.485,-6.492) AA18(3.485,-6.492) AA19(4.485,-6.492) AA20(5.485,-6.492) AA21(6.485,-6.492) AA22(7.485,-6.492) AA23(8.485,-6.492) AA24(9.485,-6.492) AA25(10.485,-6.492) AA26(11.485,-6.492) AA27(12.485,-6.492) AA28(13.485,-6.492) AB1(-13.515,-7.492) AB2(-12.515,-7.492) AB3(-11.515,-7.492) AB4(-10.515,-7.492) AB5(-9.515,-7.492) AB6(-8.515,-7.492) AB7(-7.515,-7.492) AB8(-6.515,-7.492) AB9(-5.515,-7.492) AB10(-4.515,-7.492) AB11(-3.515,-7.492) AB12(-2.515,-7.492) AB13(-1.515,-7.492) AB14(-0.515,-7.492) AB15(0.485,-7.492) AB16(1.485,-7.492) AB17(2.485,-7.492) AB18(3.485,-7.492) AB19(4.485,-7.492) AB20(5.485,-7.492) AB21(6.485,-7.492) AB22(7.485,-7.492) AB23(8.485,-7.492) AB24(9.485,-7.492) AB25(10.485,-7.492) AB26(11.485,-7.492) AB27(12.485,-7.492) AB28(13.485,-7.492) AC1(-13.515,-8.492) AC2(-12.515,-8.492) AC3(-11.515,-8.492) AC4(-10.515,-8.492) AC5(-9.515,-8.492) AC6(-8.515,-8.492) AC7(-7.515,-8.492) AC8(-6.515,-8.492) AC9(-5.515,-8.492) AC10(-4.515,-8.492) AC11(-3.515,-8.492) AC12(-2.515,-8.492) AC13(-1.515,-8.492) AC14(-0.515,-8.492) AC15(0.485,-8.492) AC16(1.485,-8.492) AC17(2.485,-8.492) AC18(3.485,-8.492) AC19(4.485,-8.492) AC20(5.485,-8.492) AC21(6.485,-8.492) AC22(7.485,-8.492) AC23(8.485,-8.492) AC24(9.485,-8.492) AC25(10.485,-8.492) AC26(11.485,-8.492) AC27(12.485,-8.492) AC28(13.485,-8.492) AD1(-13.515,-9.492) AD2(-12.515,-9.492) AD3(-11.515,-9.492) AD4(-10.515,-9.492) AD5(-9.515,-9.492) AD6(-8.515,-9.492) AD7(-7.515,-9.492) AD8(-6.515,-9.492) AD9(-5.515,-9.492) AD10(-4.515,-9.492) AD11(-3.515,-9.492) AD12(-2.515,-9.492) AD13(-1.515,-9.492) AD14(-0.515,-9.492) AD15(0.485,-9.492) AD16(1.485,-9.492) AD17(2.485,-9.492) AD18(3.485,-9.492) AD19(4.485,-9.492) AD20(5.485,-9.492) AD21(6.485,-9.492) AD22(7.485,-9.492) AD23(8.485,-9.492) AD24(9.485,-9.492) AD25(10.485,-9.492) AD26(11.485,-9.492) AD27(12.485,-9.492) AD28(13.485,-9.492) AE1(-13.515,-10.492) AE2(-12.515,-10.492) AE3(-11.515,-10.492) AE4(-10.515,-10.492) AE5(-9.515,-10.492) AE6(-8.515,-10.492) AE7(-7.515,-10.492) AE8(-6.515,-10.492) AE9(-5.515,-10.492) AE10(-4.515,-10.492) AE11(-3.515,-10.492) AE12(-2.515,-10.492) AE13(-1.515,-10.492) AE14(-0.515,-10.492) AE15(0.485,-10.492) AE16(1.485,-10.492) AE17(2.485,-10.492) AE18(3.485,-10.492) AE19(4.485,-10.492) AE20(5.485,-10.492) AE21(6.485,-10.492) AE22(7.485,-10.492) AE23(8.485,-10.492) AE24(9.485,-10.492) AE25(10.485,-10.492) AE26(11.485,-10.492) AE27(12.485,-10.492) AE28(13.485,-10.492) AF1(-13.515,-11.492) AF2(-12.515,-11.492) AF3(-11.515,-11.492) AF4(-10.515,-11.492) AF5(-9.515,-11.492) AF6(-8.515,-11.492) AF7(-7.515,-11.492) AF8(-6.515,-11.492) AF9(-5.515,-11.492) AF10(-4.515,-11.492) AF11(-3.515,-11.492) AF12(-2.515,-11.492) AF13(-1.515,-11.492) AF14(-0.515,-11.492) AF15(0.485,-11.492) AF16(1.485,-11.492) AF17(2.485,-11.492) AF18(3.485,-11.492) AF19(4.485,-11.492) AF20(5.485,-11.492) AF21(6.485,-11.492) AF22(7.485,-11.492) AF23(8.485,-11.492) AF24(9.485,-11.492) AF25(10.485,-11.492) AF26(11.485,-11.492) AF27(12.485,-11.492) AF28(13.485,-11.492) AG1(-13.515,-12.492) AG2(-12.515,-12.492) AG3(-11.515,-12.492) AG4(-10.515,-12.492) AG5(-9.515,-12.492) AG6(-8.515,-12.492) AG7(-7.515,-12.492) AG8(-6.515,-12.492) AG9(-5.515,-12.492) AG10(-4.515,-12.492) AG11(-3.515,-12.492) AG12(-2.515,-12.492) AG13(-1.515,-12.492) AG14(-0.515,-12.492) AG15(0.485,-12.492) AG16(1.485,-12.492) AG17(2.485,-12.492) AG18(3.485,-12.492) AG19(4.485,-12.492) AG20(5.485,-12.492) AG21(6.485,-12.492) AG22(7.485,-12.492) AG23(8.485,-12.492) AG24(9.485,-12.492) AG25(10.485,-12.492) AG26(11.485,-12.492) AG27(12.485,-12.492) AG28(13.485,-12.492) AH1(-13.515,-13.492) AH2(-12.515,-13.492) AH3(-11.515,-13.492) AH4(-10.515,-13.492) AH5(-9.515,-13.492) AH6(-8.515,-13.492) AH7(-7.515,-13.492) AH8(-6.515,-13.492) AH9(-5.515,-13.492) AH10(-4.515,-13.492) AH11(-3.515,-13.492) AH12(-2.515,-13.492) AH13(-1.515,-13.492) AH14(-0.515,-13.492) AH15(0.485,-13.492) AH16(1.485,-13.492) AH17(2.485,-13.492) AH18(3.485,-13.492) AH19(4.485,-13.492) AH20(5.485,-13.492) AH21(6.485,-13.492) AH22(7.485,-13.492) AH23(8.485,-13.492) AH24(9.485,-13.492) AH25(10.485,-13.492) AH26(11.485,-13.492) AH27(12.485,-13.492) AH28(13.485,-13.492) B1(-13.515,12.508) B2(-12.515,12.508) B3(-11.515,12.508) B4(-10.515,12.508) B5(-9.515,12.508) B6(-8.515,12.508) B7(-7.515,12.508) B8(-6.515,12.508) B9(-5.515,12.508) B10(-4.515,12.508) B11(-3.515,12.508) B12(-2.515,12.508) B13(-1.515,12.508) B14(-0.515,12.508) B15(0.485,12.508) B16(1.485,12.508) B17(2.485,12.508) B18(3.485,12.508) B19(4.485,12.508) B20(5.485,12.508) B21(6.485,12.508) B22(7.485,12.508) B23(8.485,12.508) B24(9.485,12.508) B25(10.485,12.508) B26(11.485,12.508) B27(12.485,12.508) B28(13.485,12.508) C1(-13.515,11.508) C2(-12.515,11.508) C3(-11.515,11.508) C4(-10.515,11.508) C5(-9.515,11.508) C6(-8.515,11.508) C7(-7.515,11.508) C8(-6.515,11.508) C9(-5.515,11.508) C10(-4.515,11.508) C11(-3.515,11.508) C12(-2.515,11.508) C13(-1.515,11.508) C14(-0.515,11.508) C15(0.485,11.508) C16(1.485,11.508) C17(2.485,11.508) C18(3.485,11.508) C19(4.485,11.508) C20(5.485,11.508) C21(6.485,11.508) C22(7.485,11.508) C23(8.485,11.508) C24(9.485,11.508) C25(10.485,11.508) C26(11.485,11.508) C27(12.485,11.508) C28(13.485,11.508) D1(-13.515,10.508) D2(-12.515,10.508) D3(-11.515,10.508) D4(-10.515,10.508) D5(-9.515,10.508) D6(-8.515,10.508) D7(-7.515,10.508) D8(-6.515,10.508) D9(-5.515,10.508) D10(-4.515,10.508) D11(-3.515,10.508) D12(-2.515,10.508) D13(-1.515,10.508) D14(-0.515,10.508) D15(0.485,10.508) D16(1.485,10.508) D17(2.485,10.508) D18(3.485,10.508) D19(4.485,10.508) D20(5.485,10.508) D21(6.485,10.508) D22(7.485,10.508) D23(8.485,10.508) D24(9.485,10.508) D25(10.485,10.508) D26(11.485,10.508) D27(12.485,10.508) D28(13.485,10.508) E1(-13.515,9.508) E2(-12.515,9.508) E3(-11.515,9.508) E4(-10.515,9.508) E5(-9.515,9.508) E6(-8.515,9.508) E7(-7.515,9.508) E8(-6.515,9.508) E9(-5.515,9.508) E10(-4.515,9.508) E11(-3.515,9.508) E12(-2.515,9.508) E13(-1.515,9.508) E14(-0.515,9.508) E15(0.485,9.508) E16(1.485,9.508) E17(2.485,9.508) E18(3.485,9.508) E19(4.485,9.508) E20(5.485,9.508) E21(6.485,9.508) E22(7.485,9.508) E23(8.485,9.508) E24(9.485,9.508) E25(10.485,9.508) E26(11.485,9.508) E27(12.485,9.508) E28(13.485,9.508) F1(-13.515,8.508) F2(-12.515,8.508) F3(-11.515,8.508) F4(-10.515,8.508) F5(-9.515,8.508) F6(-8.515,8.508) F7(-7.515,8.508) F8(-6.515,8.508) F9(-5.515,8.508) F10(-4.515,8.508) F11(-3.515,8.508) F12(-2.515,8.508) F13(-1.515,8.508) F14(-0.515,8.508) F15(0.485,8.508) F16(1.485,8.508) F17(2.485,8.508) F18(3.485,8.508) F19(4.485,8.508) F20(5.485,8.508) F21(6.485,8.508) F22(7.485,8.508) F23(8.485,8.508) F24(9.485,8.508) F25(10.485,8.508) F26(11.485,8.508) F27(12.485,8.508) F28(13.485,8.508) G1(-13.515,7.508) G2(-12.515,7.508) G3(-11.515,7.508) G4(-10.515,7.508) G5(-9.515,7.508) G6(-8.515,7.508) G7(-7.515,7.508) G8(-6.515,7.508) G9(-5.515,7.508) G10(-4.515,7.508) G11(-3.515,7.508) G12(-2.515,7.508) G13(-1.515,7.508) G14(-0.515,7.508) G15(0.485,7.508) G16(1.485,7.508) G17(2.485,7.508) G18(3.485,7.508) G19(4.485,7.508) G20(5.485,7.508) G21(6.485,7.508) G22(7.485,7.508) G23(8.485,7.508) G24(9.485,7.508) G25(10.485,7.508) G26(11.485,7.508) G27(12.485,7.508) G28(13.485,7.508) H1(-13.515,6.508) H2(-12.515,6.508) H3(-11.515,6.508) H4(-10.515,6.508) H5(-9.515,6.508) H6(-8.515,6.508) H7(-7.515,6.508) H8(-6.515,6.508) H9(-5.515,6.508) H10(-4.515,6.508) H11(-3.515,6.508) H12(-2.515,6.508) H13(-1.515,6.508) H14(-0.515,6.508) H15(0.485,6.508) H16(1.485,6.508) H17(2.485,6.508) H18(3.485,6.508) H19(4.485,6.508) H20(5.485,6.508) H21(6.485,6.508) H22(7.485,6.508) H23(8.485,6.508) H24(9.485,6.508) H25(10.485,6.508) H26(11.485,6.508) H27(12.485,6.508) H28(13.485,6.508) J1(-13.515,5.508) J2(-12.515,5.508) J3(-11.515,5.508) J4(-10.515,5.508) J5(-9.515,5.508) J6(-8.515,5.508) J7(-7.515,5.508) J8(-6.515,5.508) J9(-5.515,5.508) J10(-4.515,5.508) J11(-3.515,5.508) J12(-2.515,5.508) J13(-1.515,5.508) J14(-0.515,5.508) J15(0.485,5.508) J16(1.485,5.508) J17(2.485,5.508) J18(3.485,5.508) J19(4.485,5.508) J20(5.485,5.508) J21(6.485,5.508) J22(7.485,5.508) J23(8.485,5.508) J24(9.485,5.508) J25(10.485,5.508) J26(11.485,5.508) J27(12.485,5.508) J28(13.485,5.508) K1(-13.515,4.508) K2(-12.515,4.508) K3(-11.515,4.508) K4(-10.515,4.508) K5(-9.515,4.508) K6(-8.515,4.508) K7(-7.515,4.508) K8(-6.515,4.508) K9(-5.515,4.508) K10(-4.515,4.508) K11(-3.515,4.508) K12(-2.515,4.508) K13(-1.515,4.508) K14(-0.515,4.508) K15(0.485,4.508) K16(1.485,4.508) K17(2.485,4.508) K18(3.485,4.508) K19(4.485,4.508) K20(5.485,4.508) K21(6.485,4.508) K22(7.485,4.508) K23(8.485,4.508) K24(9.485,4.508) K25(10.485,4.508) K26(11.485,4.508) K27(12.485,4.508) K28(13.485,4.508) L1(-13.515,3.508) L2(-12.515,3.508) L3(-11.515,3.508) L4(-10.515,3.508) L5(-9.515,3.508) L6(-8.515,3.508) L7(-7.515,3.508) L8(-6.515,3.508) L9(-5.515,3.508) L10(-4.515,3.508) L11(-3.515,3.508) L12(-2.515,3.508) L13(-1.515,3.508) L14(-0.515,3.508) L15(0.485,3.508) L16(1.485,3.508) L17(2.485,3.508) L18(3.485,3.508) L19(4.485,3.508) L20(5.485,3.508) L21(6.485,3.508) L22(7.485,3.508) L23(8.485,3.508) L24(9.485,3.508) L25(10.485,3.508) L26(11.485,3.508) L27(12.485,3.508) L28(13.485,3.508) M1(-13.515,2.508) M2(-12.515,2.508) M3(-11.515,2.508) M4(-10.515,2.508) M5(-9.515,2.508) M6(-8.515,2.508) M7(-7.515,2.508) M8(-6.515,2.508) M9(-5.515,2.508) M10(-4.515,2.508) M11(-3.515,2.508) M12(-2.515,2.508) M13(-1.515,2.508) M14(-0.515,2.508) M15(0.485,2.508) M16(1.485,2.508) M17(2.485,2.508) M18(3.485,2.508) M19(4.485,2.508) M20(5.485,2.508) M21(6.485,2.508) M22(7.485,2.508) M23(8.485,2.508) M24(9.485,2.508) M25(10.485,2.508) M26(11.485,2.508) M27(12.485,2.508) M28(13.485,2.508) N1(-13.515,1.508) N2(-12.515,1.508) N3(-11.515,1.508) N4(-10.515,1.508) N5(-9.515,1.508) N6(-8.515,1.508) N7(-7.515,1.508) N8(-6.515,1.508) N9(-5.515,1.508) N10(-4.515,1.508) N11(-3.515,1.508) N12(-2.515,1.508) N13(-1.515,1.508) N14(-0.515,1.508) N15(0.485,1.508) N16(1.485,1.508) N17(2.485,1.508) N18(3.485,1.508) N19(4.485,1.508) N20(5.485,1.508) N21(6.485,1.508) N22(7.485,1.508) N23(8.485,1.508) N24(9.485,1.508) N25(10.485,1.508) N26(11.485,1.508) N27(12.485,1.508) N28(13.485,1.508) P1(-13.515,0.508) P2(-12.515,0.508) P3(-11.515,0.508) P4(-10.515,0.508) P5(-9.515,0.508) P6(-8.515,0.508) P7(-7.515,0.508) P8(-6.515,0.508) P9(-5.515,0.508) P10(-4.515,0.508) P11(-3.515,0.508) P12(-2.515,0.508) P13(-1.515,0.508) P14(-0.515,0.508) P15(0.485,0.508) P16(1.485,0.508) P17(2.485,0.508) P18(3.485,0.508) P19(4.485,0.508) P20(5.485,0.508) P21(6.485,0.508) P22(7.485,0.508) P23(8.485,0.508) P24(9.485,0.508) P25(10.485,0.508) P26(11.485,0.508) P27(12.485,0.508) P28(13.485,0.508) R1(-13.515,-0.492) R2(-12.515,-0.492) R3(-11.515,-0.492) R4(-10.515,-0.492) R5(-9.515,-0.492) R6(-8.515,-0.492) R7(-7.515,-0.492) R8(-6.515,-0.492) R9(-5.515,-0.492) R10(-4.515,-0.492) R11(-3.515,-0.492) R12(-2.515,-0.492) R13(-1.515,-0.492) R14(-0.515,-0.492) R15(0.485,-0.492) R16(1.485,-0.492) R17(2.485,-0.492) R18(3.485,-0.492) R19(4.485,-0.492) R20(5.485,-0.492) R21(6.485,-0.492) R22(7.485,-0.492) R23(8.485,-0.492) R24(9.485,-0.492) R25(10.485,-0.492) R26(11.485,-0.492) R27(12.485,-0.492) R28(13.485,-0.492) T1(-13.515,-1.492) T2(-12.515,-1.492) T3(-11.515,-1.492) T4(-10.515,-1.492) T5(-9.515,-1.492) T6(-8.515,-1.492) T7(-7.515,-1.492) T8(-6.515,-1.492) T9(-5.515,-1.492) T10(-4.515,-1.492) T11(-3.515,-1.492) T12(-2.515,-1.492) T13(-1.515,-1.492) T14(-0.515,-1.492) T15(0.485,-1.492) T16(1.485,-1.492) T17(2.485,-1.492) T18(3.485,-1.492) T19(4.485,-1.492) T20(5.485,-1.492) T21(6.485,-1.492) T22(7.485,-1.492) T23(8.485,-1.492) T24(9.485,-1.492) T25(10.485,-1.492) T26(11.485,-1.492) T27(12.485,-1.492) T28(13.485,-1.492) U1(-13.515,-2.492) U2(-12.515,-2.492) U3(-11.515,-2.492) U4(-10.515,-2.492) U5(-9.515,-2.492) U6(-8.515,-2.492) U7(-7.515,-2.492) U8(-6.515,-2.492) U9(-5.515,-2.492) U10(-4.515,-2.492) U11(-3.515,-2.492) U12(-2.515,-2.492) U13(-1.515,-2.492) U14(-0.515,-2.492) U15(0.485,-2.492) U16(1.485,-2.492) U17(2.485,-2.492) U18(3.485,-2.492) U19(4.485,-2.492) U20(5.485,-2.492) U21(6.485,-2.492) U22(7.485,-2.492) U23(8.485,-2.492) U24(9.485,-2.492) U25(10.485,-2.492) U26(11.485,-2.492) U27(12.485,-2.492) U28(13.485,-2.492) V1(-13.515,-3.492) V2(-12.515,-3.492) V3(-11.515,-3.492) V4(-10.515,-3.492) V5(-9.515,-3.492) V6(-8.515,-3.492) V7(-7.515,-3.492) V8(-6.515,-3.492) V9(-5.515,-3.492) V10(-4.515,-3.492) V11(-3.515,-3.492) V12(-2.515,-3.492) V13(-1.515,-3.492) V14(-0.515,-3.492) V15(0.485,-3.492) V16(1.485,-3.492) V17(2.485,-3.492) V18(3.485,-3.492) V19(4.485,-3.492) V20(5.485,-3.492) V21(6.485,-3.492) V22(7.485,-3.492) V23(8.485,-3.492) V24(9.485,-3.492) V25(10.485,-3.492) V26(11.485,-3.492) V27(12.485,-3.492) V28(13.485,-3.492) W1(-13.515,-4.492) W2(-12.515,-4.492) W3(-11.515,-4.492) W4(-10.515,-4.492) W5(-9.515,-4.492) W6(-8.515,-4.492) W7(-7.515,-4.492) W8(-6.515,-4.492) W9(-5.515,-4.492) W10(-4.515,-4.492) W11(-3.515,-4.492) W12(-2.515,-4.492) W13(-1.515,-4.492) W14(-0.515,-4.492) W15(0.485,-4.492) W16(1.485,-4.492) W17(2.485,-4.492) W18(3.485,-4.492) W19(4.485,-4.492) W20(5.485,-4.492) W21(6.485,-4.492) W22(7.485,-4.492) W23(8.485,-4.492) W24(9.485,-4.492) W25(10.485,-4.492) W26(11.485,-4.492) W27(12.485,-4.492) W28(13.485,-4.492) Y1(-13.515,-5.492) Y2(-12.515,-5.492) Y3(-11.515,-5.492) Y4(-10.515,-5.492) Y5(-9.515,-5.492) Y6(-8.515,-5.492) Y7(-7.515,-5.492) Y8(-6.515,-5.492) Y9(-5.515,-5.492) Y10(-4.515,-5.492) Y11(-3.515,-5.492) Y12(-2.515,-5.492) Y13(-1.515,-5.492) Y14(-0.515,-5.492) Y15(0.485,-5.492) Y16(1.485,-5.492) Y17(2.485,-5.492) Y18(3.485,-5.492) Y19(4.485,-5.492) Y20(5.485,-5.492) Y21(6.485,-5.492) Y22(7.485,-5.492) Y23(8.485,-5.492) Y24(9.485,-5.492) Y25(10.485,-5.492) Y26(11.485,-5.492) Y27(12.485,-5.492) Y28(13.485,-5.492)
Top Overlay:
  circle w0.25: c-15.165,14.358 r0.125
  region: -13.515,14.508 -14.515,13.508 -14.515,14.508
  lines w0.2: -14.515,13.508 -13.515,14.508 ; -14.515,-14.492 14.485,-14.492 14.485,14.508 -14.515,14.508 -14.515,-14.492
Mechanical 13:
  lines w0.1: -14.515,-14.492 14.485,-14.492 14.485,14.508 -14.515,14.508 -14.515,-14.492
Mechanical 15:
  lines w0.05: -15.515,-15.492 15.485,-15.492 15.485,15.508 -15.515,15.508 -15.515,-15.492
  lines w0.1: -0.515,0.008 0.485,0.008 ; -0.015,-0.492 -0.015,0.508
3D body "BGA784C100P28X28_2900X2900X240.step": height 2.4, standoff 0, extent -14.5,-14.5 14.5,14.5